# Altium footprint library AltiumLibraries.PcbLib: 247 footprints (part 5 of 16)
Each footprint in its own frame and in the unit in brackets; x right, y up, seen from the top. Pads: shape width x height; smd on the part's side, far side on the other; paste and mask are expansions set on the pad; w line width, h text height; cw(c..) or ccw(c..) is an arc to the next point about the centre after c.
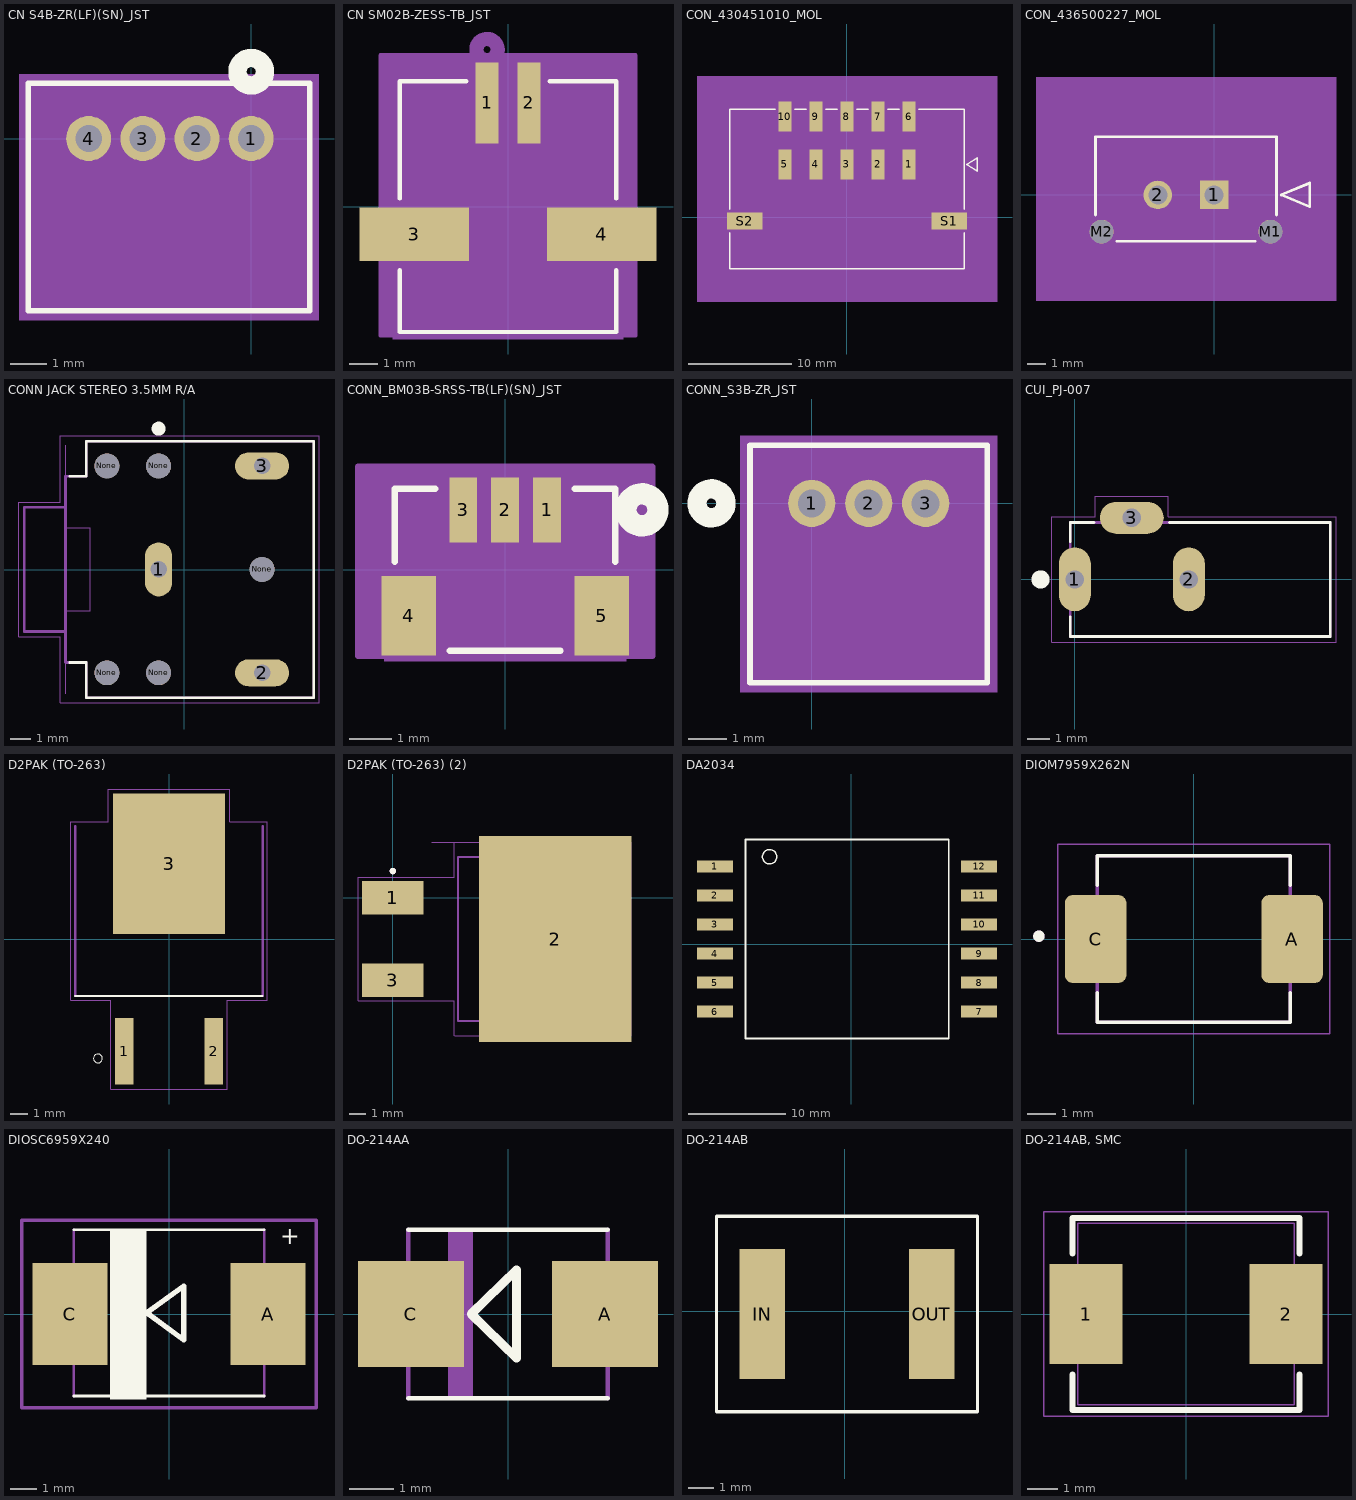
[diagram p4: the footprints below, top view; thin cyan lines are the x and y axes]

## CN S4B-ZR(LF)(SN)_JST [mil]
pads (4):
  round 49 hole 29 mask+0: 1(0,0) 2(-59.06,0) 3(-118.11,0) 4(-177.17,0)
Top Overlay:
  circle w20: c0,72.83 r15
  lines w6: -243.06,-187.88 63.94,-187.88 63.94,60.12 -243.06,60.12 -243.06,-187.88
Bottom Overlay:
  circle w20: c0,72.83 r15
Mechanical 5:
  region: -253.06,70.12 73.94,70.12 73.94,-197.88 -253.06,-197.88
Mechanical 13:
  circle w20: c0,-75 r15
  lines w1: -238.06,-182.88 58.94,-182.88 58.94,55.12 -238.06,55.12 -238.06,-182.88
Mechanical 15:
  region: 68.94,65.12 -248.06,65.12 -248.06,-192.88 68.94,-192.88
  lines w6: -248.06,-192.88 -248.06,65.12 68.94,65.12 68.94,-192.88 -248.06,-192.88
3D body: height 10, standoff 0, extent 0,0 10,10
3D body "S4B-ZR.STEP": height 146.17, standoff -105.79, extent -235.24,-181.1 60.04,55.12

## CN SM02B-ZESS-TB_JST [mil]
pads (4):
  rect 32x114 smd paste+0 mask+0: 1(-29.53,145.91) 2(29.53,145.91)
  rect 154x75 smd: 3(-131.89,-39.13) 4(131.89,-39.13)
Top Overlay:
  lines w6: -152.5,-89.73 -152.5,-176.5 152.5,-176.5 152.5,-89.73 ; -152.5,11.47 -152.5,176.5 -58.63,176.5 ; 58.63,176.5 152.5,176.5 152.5,11.47
Mechanical 5:
  region: -162.5,186.5 162.5,186.5 162.5,-186.5 -162.5,-186.5
Mechanical 13:
  circle w20: c-29.53,220.91 r15
  lines w1: -147.5,-171.5 -147.5,171.5 147.5,171.5 147.5,-171.5 -147.5,-171.5
Mechanical 15:
  region: 179.39,212.91 -179.39,212.91 -179.39,-181.5 179.39,-181.5
  lines w6: -179.39,-181.5 179.39,-181.5 179.39,212.91 -179.39,212.91 -179.39,-181.5
3D body: height 10, standoff 0, extent 0,0 10,10

## CON_430451010_MOL [mm]
pads (12):
  rect 1.27x2.92 smd paste+0 mask+0.076: 1(6,5.115) 2(3,5.115) 3(0,5.115) 4(-3,5.115) 5(-6,5.115) 6(6,9.745) 7(3,9.745) 8(0,9.745) 9(-3,9.745) 10(-6,9.745)
  rect 3.43x1.65 smd paste+0 mask+0.076: S1(9.875,-0.355) S2(-9.895,-0.355)
Top Overlay:
  lines w0.152: -11.325,-1.5 -11.325,-4.955 11.325,-4.955 11.325,-1.5 ; -11.325,0.79 -11.325,10.445 -6.955,10.445 ; -5.045,10.445 -3.955,10.445 ; -2.045,10.445 -0.955,10.445 ; 0.955,10.445 2.045,10.445 ; 3.955,10.445 5.045,10.445 ; 6.955,10.445 11.325,10.445 11.325,0.79 ; 11.579,5.115 12.595,5.75 12.595,4.48 11.579,5.115
Mechanical 5:
  region: -14.5,13.62 14.5,13.62 14.5,-8.13 -14.5,-8.13
Mechanical 13:
  lines w0.127: -11.325,-4.955 11.325,-4.955 11.325,10.445 -11.325,10.445 -11.325,-4.955 ; 11.579,5.115 12.595,5.75 12.595,4.48 11.579,5.115
Mechanical 15:
  region: 12.595,11.715 -12.595,11.715 -12.595,-6.225 12.595,-6.225
  lines w0.127: -12.595,-6.225 -12.595,11.715 12.595,11.715 12.595,-6.225 -12.595,-6.225
3D body "430451010.stp": height 8.77, standoff 0, extent -11.325,-4.955 11.325,10.445
3D body: height 0.25, standoff 0, extent 0,0 0.254,0.254

## CON_436500227_MOL [mm]
pads (4):
  rect 1.52x1.52 hole 1.02 mask+0.076: 1(0,0)
  round 1.52 hole 1.02 mask+0.076: 2(-3,0)
  round 1.27 hole 1.27 unplated mask+0.076: M1(3,-1.96) M2(-6,-1.96)
Top Overlay:
  lines w0.152: -6.325,-1.065 -6.325,3.1 3.325,3.1 3.325,-1.065 ; -5.196,-2.47 2.196,-2.47 ; 3.579,0 5.103,-0.635 5.103,0.635 3.579,0
Mechanical 5:
  region: -9.5,6.275 6.5,6.275 6.5,-5.645 -9.5,-5.645
Mechanical 13:
  lines w0.127: -6.325,-2.47 -6.325,3.1 3.325,3.1 3.325,-2.47 -6.325,-2.47 ; 3.579,0 5.103,-0.635 5.103,0.635 3.579,0
Mechanical 15:
  region: 4.595,4.37 -7.595,4.37 -7.595,-3.74 4.595,-3.74
  lines w0.127: -7.595,-3.74 4.595,-3.74 4.595,4.37 -7.595,4.37 -7.595,-3.74
3D body "436500227.stp": height 9.91, standoff -3.17, extent -6.4,-2.47 3.25,3.135
3D body: height 0.25, standoff 0, extent 0,0 0.254,0.254

## CONN JACK STEREO 3.5MM R/A [mm]
pads (8):
  oval 1.308x2.616 hole 0.8: 1(-1.243,0.027)
  oval 2.616x1.308 hole 0.8: 2(3.757,-4.973) 3(3.757,5.027)
  round 1.2 hole 1.2 unplated: None(-3.743,-4.973) None(-3.743,5.027) None(-1.243,-4.973) None(-1.243,5.027) None(3.757,0.027)
Top Overlay:
  circle w0.34: c-1.243,6.827 r0.17
  lines w0.127: -5.543,-4.473 -4.743,-4.473 -4.743,-6.173 6.257,-6.173 6.257,6.227 -4.743,6.227 -4.743,4.527 -5.543,4.527
Mechanical 1:
  lines w0: -5.743,-5.973 -5.743,-1.973 -4.543,-1.973 -4.543,2.027 -5.743,2.027 -5.743,6.027 ; -1.643,-0.723 -1.643,0.777 -0.843,0.777 -0.843,-0.723 -1.643,-0.723 ; 3.007,-5.373 4.507,-5.373 4.507,-4.573 3.007,-4.573 3.007,-5.373 ; 3.007,4.627 4.507,4.627 4.507,5.427 3.007,5.427 3.007,4.627
Mechanical 4:
  lines w0.127: -7.743,-2.973 -5.743,-2.973 ; -7.743,-2.973 -7.743,3.027 ; -7.743,-2.973 -5.743,-2.973 ; -7.743,-2.973 -7.743,3.027 ; -7.743,3.027 -5.743,3.027 ; -7.743,3.027 -5.743,3.027 ; -5.743,-4.473 -4.743,-4.473 ; -5.743,-4.473 -5.743,-2.973 ; -5.743,-4.473 -4.743,-4.473 ; -5.743,-4.473 -5.743,-2.973 ; -5.743,-2.973 -5.743,3.027 ; -5.743,-2.973 -5.743,3.027 ; -5.743,3.027 -5.743,4.527 ; -5.743,3.027 -5.743,4.527 ; -5.743,4.527 -4.743,4.527 ; -5.743,4.527 -4.743,4.527 ; -4.743,-6.173 -4.743,-4.473 ; -4.743,-6.173 6.257,-6.173 ; -4.743,-6.173 -4.743,-4.473 ; -4.743,-6.173 6.257,-6.173 ; -4.743,4.527 -4.743,6.227 ; -4.743,4.527 -4.743,6.227 ; -4.743,6.227 6.257,6.227 ; -4.743,6.227 6.257,6.227 ; 6.257,-6.173 6.257,6.227 ; 6.257,-6.173 6.257,6.227
Mechanical 15:
  lines w0.05: -7.993,-3.223 -7.993,3.277 -5.993,3.277 -5.993,6.477 6.507,6.477 6.507,-6.423 -5.993,-6.423 -5.993,-3.223 -7.993,-3.223

## CONN_BM03B-SRSS-TB(LF)(SN)_JST [mil]
pads (5):
  rect 26x61 smd paste+0 mask+0: 1(39.37,56.24) 2(0,56.24) 3(-39.37,56.24)
  rect 51x75 smd: 4(-90.55,-43.17) 5(90.55,-43.17)
Top Overlay:
  circle w20: c128.5,56.24 r15
  lines w6: -103.5,7.43 -103.5,76 -65.47,76 ; -51.95,-76 51.95,-76 ; 65.47,76 103.5,76 103.5,7.43
Bottom Overlay:
  circle w20: c128.5,56.24 r15
Mechanical 5:
  region: -113.5,86 113.5,86 113.5,-86 -113.5,-86
Mechanical 13:
  circle w20: c39.37,-18.76 r15
  lines w1: -98.5,-71 -98.5,71 98.5,71 98.5,-71 -98.5,-71
Mechanical 15:
  region: 138.05,96.74 -138.05,96.74 -138.05,-81 138.05,-81
  lines w6: -138.05,-81 138.05,-81 138.05,96.74 -138.05,96.74 -138.05,-81
3D body "BM03B-SRSS-TB.STEP": height 167.32, standoff -2.76, extent -98.43,-70.73 98.43,71
3D body: height 10, standoff 0, extent 0,0 10,10

## CONN_S3B-ZR_JST [mil]
pads (3):
  round 49 hole 29 mask+0: 1(0,0) 2(59.06,0) 3(118.11,0)
Top Overlay:
  circle w20: c-103.94,0 r15
  lines w6: -63.94,-185.88 182.06,-185.88 182.06,60.12 -63.94,60.12 -63.94,-185.88
Bottom Overlay:
  circle w20: c-103.94,0 r15
Mechanical 5:
  region: -73.94,70.12 192.06,70.12 192.06,-195.88 -73.94,-195.88
Mechanical 13:
  lines w1: -58.94,-180.88 177.06,-180.88 177.06,55.12 -58.94,55.12 -58.94,-180.88
Mechanical 15:
  region: 187.06,65.12 -68.94,65.12 -68.94,-190.88 187.06,-190.88
  lines w6: -68.94,-190.88 -68.94,65.12 187.06,65.12 187.06,-190.88 -68.94,-190.88
3D body: height 10, standoff 0, extent 0,0 10,10

## CUI_PJ-007 [mm]
pads (3):
  oval 1.4x2.8 hole 0.8: 1(0,0) 2(5,0)
  oval 2.8x1.4 hole 0.8: 3(2.5,2.7)
Top Overlay:
  circle w0.4: c-1.5,0 r0.2
  lines w0.127: -0.2,-1.65 -0.2,-2.5 11.2,-2.5 11.2,2.5 4.15,2.5 ; -0.2,1.65 -0.2,2.5 0.85,2.5
Mechanical 1:
  lines w0: -0.4,-0.75 -0.4,0.75 0.4,0.75 0.4,-0.75 -0.4,-0.75 ; 1.75,2.3 1.75,3.1 3.25,3.1 3.25,2.3 1.75,2.3 ; 4.6,-0.75 4.6,0.75 5.4,0.75 5.4,-0.75 4.6,-0.75
Mechanical 4:
  lines w0.127: -0.2,-2.5 -0.2,2.5 ; -0.2,-2.5 11.2,-2.5 ; -0.2,-2.5 -0.2,2.5 ; -0.2,-2.5 11.2,-2.5 ; -0.2,2.5 11.2,2.5 ; -0.2,2.5 11.2,2.5 ; 11.2,-2.5 11.2,2.5 ; 11.2,-2.5 11.2,2.5
Mechanical 15:
  lines w0.05: -1,-2.75 11.45,-2.75 11.45,2.75 4.1,2.75 4.1,3.65 0.9,3.65 0.9,2.75 -1,2.75 -1,-2.75

## D2PAK (TO-263) [mm]
pads (3):
  rect 1.06x3.78 smd: 1(-2.54,-6.4) 2(2.54,-6.4)
  rect 6.39x8 smd paste-5 mask+0: 3(0,4.29)
Top Overlay:
  circle w0: c-4.05,-6.8 r0.25
  lines w0.12: -5.34,-3.24 5.32,-3.24
Top Paste:
  region: 3.05,5.916 1.454,5.916 1.454,8.15 3.05,8.15
  region: -1.45,5.932 -3.066,5.932 -3.066,8.15 -1.45,8.15
  region: 3.05,0.401 1.456,0.401 1.456,2.65 3.05,2.65
  region: 0.8,0.401 -0.803,0.401 -0.803,2.65 0.8,2.65
  region: -1.45,0.4 -3.058,0.4 -3.058,2.65 -1.45,2.65
  region: 3.05,3.158 1.454,3.158 1.454,5.4 3.05,5.4
  region: 0.8,3.16 -0.803,3.16 -0.803,5.4 0.8,5.4
  region: -1.45,3.162 -3.062,3.162 -3.062,5.4 -1.45,5.4
  region: 0.8,5.927 -0.804,5.927 -0.804,8.15 0.8,8.15
Top Solder:
  region: 3.3,0.201 -3.309,0.201 -3.309,8.4 3.3,8.4
Mechanical 13:
  lines w0.12: -5.34,-3.24 -5.34,6.42 ; 5.34,-3.24 5.34,6.42
Mechanical 15:
  lines w0.05: -5.59,-3.49 -3.32,-3.49 -3.32,-8.54 3.32,-8.54 3.32,-3.49 5.59,-3.49 5.59,6.67 3.45,6.67 3.45,8.54 -3.45,8.54 -3.45,6.67 -5.59,6.67 -5.59,-3.49
3D body "IRL530NSTRLPBF.STEP": height 4.83, standoff -0.25, extent -5.08,-7.62 5.08,7.62

## D2PAK (TO-263) (2) [mm]
pads (3):
  rect 3.81x2.08 smd: 1(0,0) 3(0,-5.08)
  rect 9.45x12.7 smd paste-7: 2(10.033,-2.54)
Top Overlay:
  circle w0.2: c0,1.66 r0.1
Top Paste:
  region: 9.573,-2.235 8.263,-2.235 8.263,-0.935 9.573,-0.935
  region: 11.803,-0.325 10.493,-0.325 10.493,0.975 11.803,0.975
  region: 7.343,-0.325 6.033,-0.325 6.033,0.975 7.343,0.975
  region: 7.343,1.585 6.033,1.585 6.033,2.885 7.343,2.885
  region: 9.573,-0.325 8.263,-0.325 8.263,0.975 9.573,0.975
  region: 9.573,1.585 8.263,1.585 8.263,2.885 9.573,2.885
  region: 11.803,-2.235 10.493,-2.235 10.493,-0.935 11.803,-0.935
  region: 11.803,1.585 10.493,1.585 10.493,2.885 11.803,2.885
  region: 14.033,-2.235 12.723,-2.235 12.723,-0.935 14.033,-0.935
  region: 14.033,-0.325 12.723,-0.325 12.723,0.975 14.033,0.975
  region: 7.343,-2.235 6.033,-2.235 6.033,-0.935 7.343,-0.935
  region: 14.033,1.585 12.723,1.585 12.723,2.885 14.033,2.885
  region: 7.343,-6.055 6.033,-6.055 6.033,-4.755 7.343,-4.755
  region: 7.343,-4.145 6.033,-4.145 6.033,-2.845 7.343,-2.845
  region: 9.573,-7.965 8.263,-7.965 8.263,-6.665 9.573,-6.665
  region: 9.573,-6.055 8.263,-6.055 8.263,-4.755 9.573,-4.755
  region: 9.573,-4.145 8.263,-4.145 8.263,-2.845 9.573,-2.845
  region: 11.803,-7.965 10.493,-7.965 10.493,-6.665 11.803,-6.665
  region: 11.803,-6.055 10.493,-6.055 10.493,-4.755 11.803,-4.755
  region: 11.803,-4.145 10.493,-4.145 10.493,-2.845 11.803,-2.845
  region: 14.033,-7.965 12.723,-7.965 12.723,-6.665 14.033,-6.665
  region: 7.343,-7.965 6.033,-7.965 6.033,-6.665 7.343,-6.665
  region: 14.033,-6.055 12.723,-6.055 12.723,-4.755 14.033,-4.755
  region: 14.033,-4.145 12.723,-4.145 12.723,-2.845 14.033,-2.845
Mechanical 13:
  circle w0.2: c0,1.66 r0.1
  lines w0.127: 4.035,-7.62 11.718,-7.62 11.718,2.54 4.035,2.54 4.035,-7.62
Mechanical 15:
  lines w0.05: 2.388,3.425 14.728,3.425 14.728,-8.505 3.81,-8.505 ; 3.785,-8.505 3.785,-6.37 -2.155,-6.37 -2.155,1.29 3.785,1.29 3.785,3.425
3D body "TO263-2-1.stp": height 4.22, standoff 0, extent -0.77,-7.461 13.816,2.361

## DA2034 [mm]
pads (12):
  rect 3.7x1.27 smd: 1(-14.1,8.059) 2(-14.1,5.059) 3(-14.1,2.059) 4(-14.1,-0.941) 5(-14.1,-3.941) 6(-14.1,-6.941) 7(13.206,-6.941) 8(13.206,-3.941) 9(13.206,-0.941) 10(13.206,2.059) 11(13.206,5.059) 12(13.206,8.059)
Top Overlay:
  circle w0.16: c-8.442,9.059 r0.746
  lines w0.2: -10.932,-9.731 10.068,-9.731 10.068,10.849 -10.932,10.849 -10.932,-9.731
3D body "Coilcraft-DA2034-AL.step": height 11.18, standoff -0.25, extent -14.825,-9.685 13.825,10.885

## DIOM7959X262N [mm]
pads (2):
  rrect25% 2.18x3.12 smd: A(3.485,0) C(-3.485,0)
Top Overlay:
  circle w0.2: c-5.5,0.1 r0.1
  lines w0.127: -3.427,-1.9 -3.427,-2.953 3.427,-2.953 3.427,-1.9 ; -3.427,1.9 -3.427,2.953 3.427,2.953 3.427,1.9
Mechanical 13:
  circle w0.2: c-5.5,0.1 r0.1
  lines w0.127: -3.427,-2.953 -3.427,2.953 3.427,2.953 3.427,-2.953 -3.427,-2.953
Mechanical 15:
  lines w0.05: -4.83,-3.36 -4.83,3.36 4.83,3.36 4.83,-3.36 -4.83,-3.36
3D body "DO-214AB.SLDPRT": height 2.94, standoff 0.01, extent -4.1,-3.125 3.95,3.125

## DIOSC6959X240 [mm]
pads (2):
  rect 2.8x3.8 smd: A(3.7,0) C(-3.7,0)
Top Overlay:
  region: -0.85,-3.188 -2.189,-3.188 -2.189,3.142 -0.85,3.142
  lines w0.102: -3.561,-3.063 3.561,-3.063 ; -3.561,3.147 3.561,3.147
  lines w0.203: -0.83,0.042 0.543,-0.958 0.543,1.042 -0.83,0.042
  text "+" at 4.159,2.599 h0.63
Mechanical 13:
  region: 4.094,-1.096 3.718,-1.096 3.718,1.135 4.094,1.135
  region: -3.561,-1.099 -4.285,-1.099 -4.285,1.135 -3.561,1.135
  lines w0.102: -3.561,-3.063 -3.561,3.147 ; 3.561,-3.063 3.561,3.147
Mechanical 15:
  lines w0.127: -5.5,-3.5 -5.5,3.5 5.5,3.5 5.5,-3.5 -5.5,-3.5
3D body "DO-214AB.SLDPRT": height 2.56, standoff -0.37, extent -4.05,-3.05 4,3.2

## DO-214AA [mm]
pads (2):
  rect 2.4x2.4 smd: A(2.2,0) C(-2.2,0)
Top Overlay:
  lines w0.102: -2.261,-1.905 2.261,-1.905 ; -2.261,1.905 2.261,1.905
  lines w0.203: -0.83,0 0.193,1 0.193,-1 -0.83,0
Mechanical 13:
  region: -2.261,-1.094 -2.798,-1.094 -2.798,1.092 -2.261,1.092
  region: 2.794,-1.094 2.265,-1.094 2.265,1.092 2.794,1.092
  region: -0.8,-1.902 -1.352,-1.902 -1.352,1.9 -0.8,1.9
  lines w0.102: -2.261,-1.905 -2.261,1.905 ; 2.261,-1.905 2.261,1.905
3D body "DO-214AA(SMB).SLDPRT": height 2.56, standoff 0.01, extent -2.774,-1.968 2.774,1.968

## DO-214AB [mil]
pads (2):
  rect 70x200 smd: IN(-126.89,-4.41) OUT(133.11,-4.41)
Top Overlay:
  lines w5: -196.89,-154.41 203.11,-154.41 203.11,145.59 -196.89,145.59 -196.89,-154.41

## DO-214AB, SMC [mm]
pads (2):
  rect 2.4x3.3 smd: 1(-3.3,0) 2(3.3,0)
Top Overlay:
  lines w0.2: -3.75,-2 -3.75,-3.175 3.75,-3.175 3.75,-2 ; -3.75,2 -3.75,3.175 3.75,3.175 3.75,2
Mechanical 13:
  lines w0.05: -3.575,-3 3.575,-3 3.575,3 -3.575,3 -3.575,-3
Mechanical 15:
  lines w0.05: -4.7,-3.375 4.7,-3.375 4.7,3.375 -4.7,3.375 -4.7,-3.375